# Altium footprint library ICs And Semiconductors THD.PcbLib: 292 footprints (part 17 of 19)
Each footprint in its own frame and in the unit in brackets; x right, y up, seen from the top. Pads: shape width x height; smd on the part's side, far side on the other; paste and mask are expansions set on the pad; w line width, h text height; cw(c..) or ccw(c..) is an arc to the next point about the centre after c.
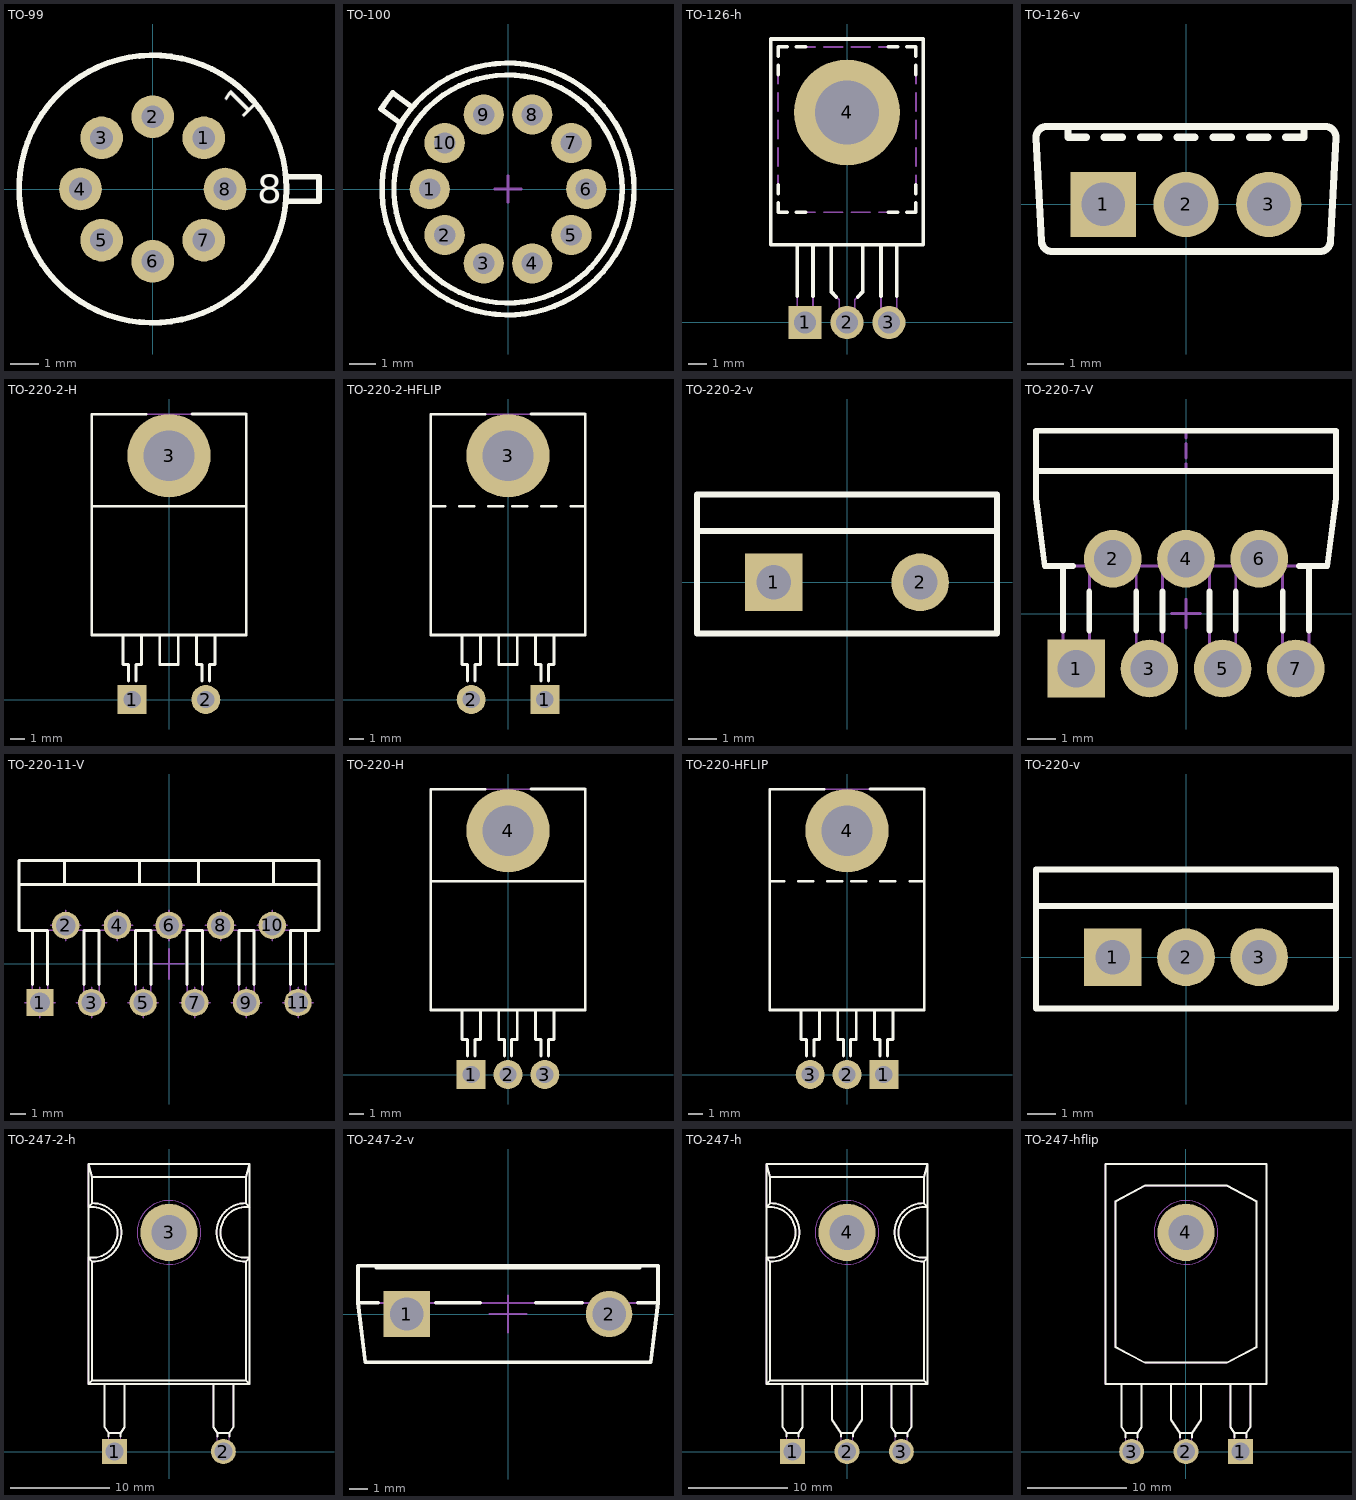
[diagram p16: the footprints below, top view; thin cyan lines are the x and y axes]

## TO-99 [mm] "TO-99, 8 Leads, Body Dia. 9.4mm (max)"
height 5.72
pads (8):
  round 1.5 hole 0.8: 1(1.796,1.796) 2(0,2.54) 3(-1.796,1.796) 4(-2.54,0) 5(-1.796,-1.796) 6(0,-2.54) 7(1.796,-1.796) 8(2.54,0)
Top Overlay:
  circle w0.2: c0,0 r4.699
  lines w0.2: 4.679,-0.432 5.842,-0.432 5.842,0.432 4.679,0.432
  text "1" at 3.098,2.391 h1
  text "8" at 3.667,-0.5 h1
Notvisible:
  text "7" at 2.239,-2.946 h1
  text "6" at -0.5,-3.69 h1
  text "5" at -2.946,-2.239 h1
  text "4" at -3.643,0.5 h1
  text "3" at -2.239,2.946 h1
  text "2" at 0.5,3.667 h1
Mechanical 14:
  circle w0.1: c0,0 r4.699
  lines w0.1: 4.679,-0.432 5.842,-0.432 5.842,0.432 4.679,0.432
3D body "TO-99.stp": height 5.72, standoff -3.78, extent -4.7,-4.7 5.842,4.7

## TO-100 [mm] "TO-100, 10 Leads, Body Dia. 9.4mm (max)"
height 6.99
pads (10):
  round 1.5 hole 0.8: 1(-2.92,0) 2(-2.362,-1.716) 3(-0.902,-2.777) 4(0.902,-2.777) 5(2.362,-1.716) 6(2.92,0) 7(2.362,1.716) 8(0.902,2.777) 9(-0.902,2.777) 10(-2.362,1.716)
Top Overlay:
  circle w0.2: c0,0 r4.7
  circle w0.2: c0,0 r4.255
  lines w0.2: -4.747,2.985 -4.011,2.45 ; -4.737,2.978 cw(c0,0) -4.296,3.585 ; -4.306,3.592 -3.57,3.057
Notvisible:
  lines w0.1: -3.42,0 -2.92,0 ; -2.92,-0.5 -2.92,0 ; -2.92,0.5 -2.92,0 ; -2.767,-2.01 -2.362,-1.716 ; -2.767,2.01 -2.362,1.716 ; -2.656,-1.312 -2.362,-1.716 ; -2.656,1.312 -2.362,1.716 ; -2.42,0 -2.92,0 ; -2.068,-2.121 -2.362,-1.716 ; -2.068,2.121 -2.362,1.716 ; -1.958,-1.422 -2.362,-1.716 ; -1.958,1.422 -2.362,1.716 ; -1.378,-2.623 -0.902,-2.777 ; -1.378,2.623 -0.902,2.777 ; -1.057,-3.253 -0.902,-2.777 ; -1.057,3.253 -0.902,2.777 ; -0.748,-2.302 -0.902,-2.777 ; -0.748,2.302 -0.902,2.777 ; -0.5,0 0,0 ; -0.427,-2.932 -0.902,-2.777 ; -0.427,2.932 -0.902,2.777 ; 0,-0.5 0,0 ; 0,0.5 0,0 ; 0.427,-2.932 0.902,-2.777 ; 0.427,2.932 0.902,2.777 ; 0.5,0 0,0 ; 0.748,-2.302 0.902,-2.777 ; 0.748,2.302 0.902,2.777 ; 1.057,-3.253 0.902,-2.777 ; 1.057,3.253 0.902,2.777 ; 1.378,-2.623 0.902,-2.777 ; 1.378,2.623 0.902,2.777 ; 1.958,-1.422 2.362,-1.716 ; 1.958,1.422 2.362,1.716 ; 2.068,-2.121 2.362,-1.716 ; 2.068,2.121 2.362,1.716 ; 2.42,0 2.92,0 ; 2.656,-1.312 2.362,-1.716 ; 2.656,1.312 2.362,1.716 ; 2.767,-2.01 2.362,-1.716 ; 2.767,2.01 2.362,1.716 ; 2.92,-0.5 2.92,0 ; 2.92,0.5 2.92,0 ; 3.42,0 2.92,0
Mechanical 14:
  circle w0.1: c0,0 r4.7
  circle w0.1: c0,0 r4.255
  lines w0.1: -4.747,2.985 -4.011,2.45 cw(c0,0) -3.57,3.057 -4.306,3.592 ; -4.737,2.978 cw(c0,0) -4.296,3.585
3D body "TO-100.stp": height 5.97, standoff -3.6, extent -4.737,-4.7 4.7,4.7

## TO-126-h [mm] "TO-126 3-Terminal - Horizontal Mount"
height 3.45
pads (4):
  rect 1.8x1.8 hole 1.2: 1(-2.28,0)
  round 1.8 hole 1.2: 2(0,0) 3(2.28,0)
  round 5.75 hole 3.5: 4(0,11.43)
Top Overlay:
  lines w0.2: -3.75,6.5 -3.75,6 -3.25,6 ; -3.75,7 -3.75,7.5 ; -3.75,13.5 -3.75,14 ; -3.75,14.5 -3.75,15 -3.25,15 ; -2.75,6 -2.25,6 ; -2.75,15 -2.25,15 ; -2.705,1.439 -2.705,4.23 ; -1.855,1.439 -1.855,4.23 ; -0.85,4.23 -0.85,1.655 -0.579,1.384 ; 0.579,1.384 0.85,1.655 0.85,4.23 ; 1.855,1.439 1.855,4.23 ; 2.25,6 2.75,6 ; 2.25,15 2.75,15 ; 2.705,1.439 2.705,4.23 ; 3.25,6 3.75,6 3.75,6.5 ; 3.25,15 3.75,15 3.75,14.5 ; 3.75,7 3.75,7.5 ; 3.75,13.5 3.75,14 ; -4.15,4.23 -4.15,15.43 4.15,15.43 4.15,4.23 -4.15,4.23
Mechanical 14:
  circle w0.1: c0,11.43 r1.75
  lines w0.1: -3.75,6.5 -3.75,6 -3.25,6 ; -3.75,7 -3.75,8 ; -3.75,8.5 -3.75,9.5 ; -3.75,10 -3.75,11 ; -3.75,11.5 -3.75,12.5 ; -3.75,13 -3.75,14 ; -3.75,14.5 -3.75,15 -3.25,15 ; -2.75,6 -1.75,6 ; -2.75,15 -1.75,15 ; -2.705,4.23 -2.705,0 -1.855,0 -1.855,4.23 ; -1.25,6 -0.25,6 ; -1.25,15 -0.25,15 ; -0.85,4.23 -0.85,1.655 -0.425,1.23 -0.425,0 0.425,0 0.425,1.23 0.85,1.655 0.85,4.23 ; 0.25,6 1.25,6 ; 0.25,15 1.25,15 ; 1.75,6 2.75,6 ; 1.75,15 2.75,15 ; 1.855,4.23 1.855,0 2.705,0 2.705,4.23 ; 3.25,6 3.75,6 3.75,6.5 ; 3.25,15 3.75,15 3.75,14.5 ; 3.75,7 3.75,8 ; 3.75,8.5 3.75,9.5 ; 3.75,10 3.75,11 ; 3.75,11.5 3.75,12.5 ; 3.75,13 3.75,14 ; -4.15,4.23 4.15,4.23 4.15,15.43 -4.15,15.43 -4.15,4.23
3D body "TO-126-H.stp": height 3.45, standoff -3.1, extent -4.134,-0.3 4.134,15.43

## TO-126-v [mm] "TO-126 3-Terminal - Vertical Mount"
height 14.2
pads (3):
  rect 1.8x1.8 hole 1.2: 1(-2.28,0)
  round 1.8 hole 1.2: 2(0,0) 3(2.28,0)
Top Overlay:
  lines w0.2: -3.25,2.15 -3.25,1.85 -2.75,1.85 ; -2.25,1.85 -1.75,1.85 ; -1.25,1.85 -0.75,1.85 ; -0.25,1.85 0.25,1.85 ; 0.75,1.85 1.25,1.85 ; 1.75,1.85 2.25,1.85 ; 2.75,1.85 3.25,1.85 3.25,2.15 ; -4.133,1.834 cw(c-3.834,1.85) -3.834,2.15 3.834,2.15 cw(c3.834,1.85) 4.133,1.834 3.984,-1.016 cw(c3.685,-1) 3.685,-1.3 -3.685,-1.3 cw(c-3.685,-1) -3.984,-1.016 -4.133,1.834
Mechanical 14:
  lines w0.1: -3.25,2.15 -3.25,1.85 -2.75,1.85 ; -2.25,1.85 -1.75,1.85 ; -1.25,1.85 -0.75,1.85 ; -0.25,1.85 0.25,1.85 ; 0.75,1.85 1.25,1.85 ; 1.75,1.85 2.25,1.85 ; 2.75,1.85 3.25,1.85 3.25,2.15 ; -4.133,1.834 cw(c-3.834,1.85) -3.834,2.15 3.834,2.15 cw(c3.834,1.85) 4.133,1.834 3.984,-1.016 cw(c3.685,-1) 3.685,-1.3 -3.685,-1.3 cw(c-3.685,-1) -3.984,-1.016 -4.133,1.834
3D body "TO-126-V.stp": height 14.2, standoff -3.1, extent -4.134,-1.3 4.134,2.15

## TO-220-2-H [mm] "TO-220 2-Terminal + Tab - Horizontal Mount"
height 4.7
pads (3):
  rect 2x2 hole 1.2: 1(-2.54,0)
  round 2 hole 1.2: 2(2.54,0)
  round 5.75 hole 3.5: 3(0,16.828)
Top Overlay:
  lines w0.2: -5.334,13.335 5.334,13.335 ; -3.175,4.445 -3.175,2.413 -2.794,2.413 -2.794,1.27 ; -2.286,1.27 -2.286,2.413 -1.905,2.413 -1.905,4.445 ; -1.6,19.685 -5.334,19.685 -5.334,4.445 5.334,4.445 5.334,19.685 5.319,19.7 1.6,19.7 ; -0.635,4.445 -0.635,2.413 0.635,2.413 0.635,4.445 ; 1.905,4.445 1.905,2.413 2.286,2.413 2.286,1.27 ; 2.794,1.27 2.794,2.413 3.175,2.413 3.175,4.445
Mechanical 14:
  circle w0.1: c0,16.828 r2
  lines w0.1: -5.334,13.335 5.334,13.335 ; -3.175,4.445 -3.175,2.413 -2.794,2.413 -2.794,1.27 ; -2.286,1.27 -2.286,2.413 -1.905,2.413 -1.905,4.445 ; -0.635,4.445 -0.635,2.413 0.635,2.413 0.635,4.445 ; 1.905,4.445 1.905,2.413 2.286,2.413 2.286,1.27 ; 2.794,1.27 2.794,2.413 3.175,2.413 3.175,4.445 ; -5.334,4.445 -5.334,19.685 5.334,19.685 5.334,4.445 -5.334,4.445
3D body "TO-220-2-H.stp": height 4.7, standoff -3.5, extent -5.27,-0.28 5.27,19.49

## TO-220-2-HFLIP [mm] "TO-220 2-Terminal + Tab - Flipped Horizontal Mount"
height 4.7
pads (3):
  rect 2x2 hole 1.2: 1(2.54,0)
  round 2 hole 1.2: 2(-2.54,0)
  round 5.75 hole 3.5: 3(0,16.828)
Top Overlay:
  lines w0.2: -5.334,13.335 -4.334,13.335 ; -3.334,13.335 -2.334,13.335 ; -3.175,4.445 -3.175,2.413 -2.794,2.413 -2.794,1.27 ; -2.286,1.27 -2.286,2.413 -1.905,2.413 -1.905,4.445 ; -1.6,19.685 -5.334,19.685 -5.334,4.445 5.334,4.445 5.334,19.685 5.319,19.7 1.6,19.7 ; -1.334,13.335 -0.334,13.335 ; -0.635,4.445 -0.635,2.413 0.635,2.413 0.635,4.445 ; 0.3,13.335 1.3,13.335 ; 1.905,4.445 1.905,2.413 2.286,2.413 2.286,1.27 ; 2.3,13.335 3.3,13.335 ; 2.794,1.27 2.794,2.413 3.175,2.413 3.175,4.445 ; 4.334,13.335 5.334,13.335
Mechanical 14:
  circle w0.1: c0,16.828 r2
  lines w0.1: -5.334,13.335 -4.334,13.335 ; -3.334,13.335 -2.334,13.335 ; -3.175,4.445 -3.175,2.413 -2.794,2.413 -2.794,1.27 ; -2.286,1.27 -2.286,2.413 -1.905,2.413 -1.905,4.445 ; -1.334,13.335 -0.334,13.335 ; -0.635,4.445 -0.635,2.413 0.635,2.413 0.635,4.445 ; 0.3,13.335 1.3,13.335 ; 1.905,4.445 1.905,2.413 2.286,2.413 2.286,1.27 ; 2.3,13.335 3.3,13.335 ; 2.794,1.27 2.794,2.413 3.175,2.413 3.175,4.445 ; 4.334,13.335 5.334,13.335 ; -5.334,4.445 -5.334,19.685 5.334,19.685 5.334,4.445 -5.334,4.445
3D body "TO-220-2-HFLIP.stp": height 4.7, standoff -4.7, extent -5.27,-0.28 5.27,19.49

## TO-220-2-v [mm] "TO-220 2-Terminal - Vertical Mount"
height 22.86
pads (2):
  rect 2x2 hole 1.2: 1(-2.54,0)
  round 2 hole 1.2: 2(2.54,0)
Top Overlay:
  lines w0.2: -5.207,1.778 5.207,1.778 ; -5.207,-1.778 -5.207,3.048 5.207,3.048 5.207,-1.778 -5.207,-1.778
Mechanical 14:
  lines w0.1: -5.207,1.778 5.207,1.778 ; -5.207,-1.778 -5.207,3.048 5.207,3.048 5.207,-1.778 -5.207,-1.778
3D body "TO-220-2-V.stp": height 20.5, standoff -3.5, extent -5.27,-1.75 5.27,2.95

## TO-220-7-V [mm] "TO-220 7 Leads - Vertical Mount"
height 21.37
pads (7):
  rect 2x2 hole 1.3: 1(-3.81,-1.905)
  round 2 hole 1.3: 2(-2.54,1.905) 3(-1.27,-1.905) 4(0,1.905) 5(1.27,-1.905) 6(2.54,1.905) 7(3.81,-1.905)
Top Overlay:
  lines w0.2: -5.205,4.95 5.205,4.95 ; -4.265,-0.581 -4.265,1.65 ; -3.917,1.65 -4.905,1.65 -5.205,4 -5.205,6.35 5.205,6.35 5.205,4 4.905,1.65 3.917,1.65 ; -3.355,-0.581 -3.355,0.767 ; -1.725,-0.581 -1.725,0.767 ; -0.815,-0.581 -0.815,0.767 ; 0.815,-0.581 0.815,0.767 ; 1.725,-0.581 1.725,0.767 ; 3.355,-0.581 3.355,0.767 ; 4.265,-0.581 4.265,1.65
Notvisible:
  lines w0.1: -4.31,-1.905 -3.81,-1.905 ; -3.81,-2.405 -3.81,-1.905 ; -3.81,-1.405 -3.81,-1.905 ; -3.31,-1.905 -3.81,-1.905 ; -3.04,1.905 -2.54,1.905 ; -2.54,1.405 -2.54,1.905 ; -2.54,2.405 -2.54,1.905 ; -2.04,1.905 -2.54,1.905 ; -1.77,-1.905 -1.27,-1.905 ; -1.27,-2.405 -1.27,-1.905 ; -1.27,-1.405 -1.27,-1.905 ; -0.77,-1.905 -1.27,-1.905 ; -0.5,0 0,0 ; -0.5,1.905 0,1.905 ; 0,-0.5 0,0 ; 0,0.5 0,0 ; 0,1.405 0,1.905 ; 0,2.405 0,1.905 ; 0,4.95 0,5.2 ; 0,5.4 0,5.65 0,5.9 ; 0,6.1 0,6.35 ; 0.5,0 0,0 ; 0.5,1.905 0,1.905 ; 0.77,-1.905 1.27,-1.905 ; 1.27,-2.405 1.27,-1.905 ; 1.27,-1.405 1.27,-1.905 ; 1.77,-1.905 1.27,-1.905 ; 2.04,1.905 2.54,1.905 ; 2.54,1.405 2.54,1.905 ; 2.54,2.405 2.54,1.905 ; 3.04,1.905 2.54,1.905 ; 3.31,-1.905 3.81,-1.905 ; 3.81,-2.405 3.81,-1.905 ; 3.81,-1.405 3.81,-1.905 ; 4.31,-1.905 3.81,-1.905
Mechanical 14:
  lines w0.1: -5.205,4.95 5.205,4.95 ; -4.265,1.65 -4.265,-2.23 -3.355,-2.23 -3.355,1.65 ; -2.995,1.65 -2.995,1.58 -2.085,1.58 -2.085,1.65 ; -1.725,1.65 -1.725,-2.23 -0.815,-2.23 -0.815,1.65 ; -0.455,1.65 -0.455,1.58 0.455,1.58 0.455,1.65 ; 0.815,1.65 0.815,-2.23 1.725,-2.23 1.725,1.65 ; 2.085,1.65 2.085,1.58 2.995,1.58 2.995,1.65 ; 3.355,1.65 3.355,-2.23 4.265,-2.23 4.265,1.65 ; -5.205,4 -5.205,6.35 5.205,6.35 5.205,4 4.905,1.65 -4.905,1.65 -5.205,4
3D body "TO-220-7-V.stp": height 21.74, standoff -3.8, extent -5.205,-2.23 5.205,6.35

## TO-220-11-V [mm] "TO-220 11 Leads - Vertical Mount"
height 20.82
pads (11):
  rect 1.8x1.8 hole 1.3: 1(-8.5,-2.54)
  round 1.8 hole 1.3: 2(-6.8,2.54) 3(-5.1,-2.54) 4(-3.4,2.54) 5(-1.7,-2.54) 6(0,2.54) 7(1.7,-2.54) 8(3.4,2.54) 9(5.1,-2.54) 10(6.8,2.54) 11(8.5,-2.54)
Top Overlay:
  lines w0.2: -9.88,5.23 9.88,5.23 ; -9,-1.34 -9,2.21 ; -8,-1.34 -8,2.21 -9.88,2.21 -9.88,6.83 9.88,6.83 9.88,2.21 8,2.21 8,-1.34 ; -6.88,5.23 -6.88,6.83 ; -5.6,-1.34 -5.6,2.21 -4.6,2.21 -4.6,-1.34 ; -2.2,-1.34 -2.2,2.21 -1.2,2.21 -1.2,-1.34 ; -1.93,5.23 -1.93,6.83 ; 1.2,-1.34 1.2,2.21 2.2,2.21 2.2,-1.34 ; 1.93,5.23 1.93,6.83 ; 4.6,-1.34 4.6,2.21 5.6,2.21 5.6,-1.34 ; 6.88,5.23 6.88,6.83 ; 9,-1.34 9,2.21
Notvisible:
  lines w0.1: -9.5,-2.54 -8.5,-2.54 ; -8.5,-3.54 -8.5,-2.54 ; -8.5,-1.54 -8.5,-2.54 ; -7.8,2.54 -6.8,2.54 ; -7.5,-2.54 -8.5,-2.54 ; -6.8,1.54 -6.8,2.54 ; -6.8,3.54 -6.8,2.54 ; -6.1,-2.54 -5.1,-2.54 ; -5.8,2.54 -6.8,2.54 ; -5.1,-3.54 -5.1,-2.54 ; -5.1,-1.54 -5.1,-2.54 ; -4.4,2.54 -3.4,2.54 ; -4.1,-2.54 -5.1,-2.54 ; -3.4,1.54 -3.4,2.54 ; -3.4,3.54 -3.4,2.54 ; -2.7,-2.54 -1.7,-2.54 ; -2.4,2.54 -3.4,2.54 ; -1.7,-3.54 -1.7,-2.54 ; -1.7,-1.54 -1.7,-2.54 ; -1,0 0,0 ; -1,2.54 0,2.54 ; -0.7,-2.54 -1.7,-2.54 ; 0,-1 0,0 ; 0,1 0,0 ; 0,1.54 0,2.54 ; 0,3.54 0,2.54 ; 0.7,-2.54 1.7,-2.54 ; 1,0 0,0 ; 1,2.54 0,2.54 ; 1.7,-3.54 1.7,-2.54 ; 1.7,-1.54 1.7,-2.54 ; 2.4,2.54 3.4,2.54 ; 2.7,-2.54 1.7,-2.54 ; 3.4,1.54 3.4,2.54 ; 3.4,3.54 3.4,2.54 ; 4.1,-2.54 5.1,-2.54 ; 4.4,2.54 3.4,2.54 ; 5.1,-3.54 5.1,-2.54 ; 5.1,-1.54 5.1,-2.54 ; 5.8,2.54 6.8,2.54 ; 6.1,-2.54 5.1,-2.54 ; 6.8,1.54 6.8,2.54 ; 6.8,3.54 6.8,2.54 ; 7.5,-2.54 8.5,-2.54 ; 7.8,2.54 6.8,2.54 ; 8.5,-3.54 8.5,-2.54 ; 8.5,-1.54 8.5,-2.54 ; 9.5,-2.54 8.5,-2.54
Mechanical 14:
  lines w0.1: -9.88,5.23 9.88,5.23 ; -9,2.21 -9,-2.84 -8,-2.84 -8,2.21 ; -6.88,5.23 -6.88,6.83 ; -5.6,2.21 -5.6,-2.84 -4.6,-2.84 -4.6,2.21 ; -2.2,2.21 -2.2,-2.84 -1.2,-2.84 -1.2,2.21 ; -1.93,5.23 -1.93,6.83 ; 1.2,2.21 1.2,-2.84 2.2,-2.84 2.2,2.21 ; 1.93,5.23 1.93,6.83 ; 4.6,2.21 4.6,-2.84 5.6,-2.84 5.6,2.21 ; 6.88,5.23 6.88,6.83 ; 8,2.21 8,-2.84 9,-2.84 9,2.21 ; -9.88,2.21 -9.88,6.83 9.88,6.83 9.88,2.21 -9.88,2.21
3D body "TO-220-11-V.stp": height 21.09, standoff -3.8, extent -9.88,-2.84 9.88,6.83

## TO-220-H [mm] "TO-220 3-Terminal + Tab - Horizontal Mount"
height 4.7
pads (4):
  rect 2x2 hole 1.2: 1(-2.54,0)
  round 2 hole 1.2: 2(0,0) 3(2.54,0)
  round 5.75 hole 3.5: 4(0,16.828)
Top Overlay:
  lines w0.2: -5.334,13.335 5.334,13.335 ; -3.175,4.445 -3.175,2.413 -2.794,2.413 -2.794,1.27 ; -2.286,1.27 -2.286,2.413 -1.905,2.413 -1.905,4.445 ; -1.6,19.685 -5.334,19.685 -5.334,4.445 5.334,4.445 5.334,19.685 5.319,19.7 1.6,19.7 ; -0.635,4.445 -0.635,2.413 -0.254,2.413 -0.254,1.27 ; 0.254,1.27 0.254,2.413 0.635,2.413 0.635,4.445 ; 1.905,4.445 1.905,2.413 2.286,2.413 2.286,1.27 ; 2.794,1.27 2.794,2.413 3.175,2.413 3.175,4.445
Mechanical 14:
  circle w0.1: c0,16.828 r2
  lines w0.1: -5.334,13.335 5.334,13.335 ; -3.175,4.445 -3.175,2.413 -2.794,2.413 -2.794,1.27 ; -2.286,1.27 -2.286,2.413 -1.905,2.413 -1.905,4.445 ; -0.635,4.445 -0.635,2.413 -0.254,2.413 -0.254,1.27 ; 0.254,1.27 0.254,2.413 0.635,2.413 0.635,4.445 ; 1.905,4.445 1.905,2.413 2.286,2.413 2.286,1.27 ; 2.794,1.27 2.794,2.413 3.175,2.413 3.175,4.445 ; -5.334,4.445 -5.334,19.685 5.334,19.685 5.334,4.445 -5.334,4.445
3D body "TO-220-H.stp": height 4.7, standoff -3.5, extent -5.27,-0.28 5.27,19.49

## TO-220-HFLIP [mm] "TO-220 3-Terminal + Tab - Flipped Horizontal Mount"
height 4.7
pads (4):
  rect 2x2 hole 1.2: 1(2.54,0)
  round 2 hole 1.2: 2(0,0) 3(-2.54,0)
  round 5.75 hole 3.5: 4(0,16.828)
Top Overlay:
  lines w0.2: -5.334,13.335 -4.334,13.335 ; -3.334,13.335 -2.334,13.335 ; -3.175,4.445 -3.175,2.413 -2.794,2.413 -2.794,1.27 ; -2.286,1.27 -2.286,2.413 -1.905,2.413 -1.905,4.445 ; -1.6,19.685 -5.334,19.685 -5.334,4.445 5.334,4.445 5.334,19.685 5.319,19.7 1.6,19.7 ; -1.334,13.335 -0.334,13.335 ; -0.635,4.445 -0.635,2.413 -0.254,2.413 -0.254,1.27 ; 0.254,1.27 0.254,2.413 0.635,2.413 0.635,4.445 ; 0.3,13.335 1.3,13.335 ; 1.905,4.445 1.905,2.413 2.286,2.413 2.286,1.27 ; 2.3,13.335 3.3,13.335 ; 2.794,1.27 2.794,2.413 3.175,2.413 3.175,4.445 ; 4.334,13.335 5.334,13.335
Mechanical 14:
  circle w0.1: c0,16.828 r2
  lines w0.1: -5.334,13.335 -4.334,13.335 ; -3.334,13.335 -2.334,13.335 ; -3.175,4.445 -3.175,2.413 -2.794,2.413 -2.794,1.27 ; -2.286,1.27 -2.286,2.413 -1.905,2.413 -1.905,4.445 ; -1.334,13.335 -0.334,13.335 ; -0.635,4.445 -0.635,2.413 -0.254,2.413 -0.254,1.27 ; 0.254,1.27 0.254,2.413 0.635,2.413 0.635,4.445 ; 0.3,13.335 1.3,13.335 ; 1.905,4.445 1.905,2.413 2.286,2.413 2.286,1.27 ; 2.3,13.335 3.3,13.335 ; 2.794,1.27 2.794,2.413 3.175,2.413 3.175,4.445 ; 4.334,13.335 5.334,13.335 ; -5.334,4.445 -5.334,19.685 5.334,19.685 5.334,4.445 -5.334,4.445
3D body "TO-220-HFLIP.stp": height 4.7, standoff -4.7, extent -5.27,-0.28 5.27,19.49

## TO-220-v [mm] "TO-220 3-Terminal - Vertical Mount"
height 22.86
pads (3):
  rect 2x2 hole 1.2: 1(-2.54,0)
  round 2 hole 1.2: 2(0,0) 3(2.54,0)
Top Overlay:
  lines w0.2: -5.207,1.778 5.207,1.778 ; -5.207,-1.778 5.207,-1.778 5.207,3.048 -5.207,3.048 -5.207,-1.778
Mechanical 14:
  lines w0.1: -5.207,1.778 5.207,1.778 ; -5.207,-1.778 5.207,-1.778 5.207,3.048 -5.207,3.048 -5.207,-1.778
3D body "TO-220-V.stp": height 20.5, standoff -3.5, extent -5.27,-1.75 5.27,2.95

## TO-247-2-h [mm] "TO-247 2-Terminal - Horizontal Mount"
height 5.26
pads (3):
  rect 2.5x2.5 hole 1.8: 1(-5.46,0)
  round 2.5 hole 1.8: 2(5.46,0)
  round 5.75 hole 3.5: 3(0,22)
Top Overlay:
  lines w0.2: -6.46,6.76 -6.46,2.44 -6.06,1.84 ; -6.06,1.5 -6.06,1.84 ; -4.86,1.5 -4.86,1.84 ; -4.46,6.76 -4.46,2.44 -4.86,1.84 ; 4.46,6.76 4.46,2.44 4.86,1.84 ; 4.86,1.5 4.86,1.84 ; 6.06,1.5 6.06,1.84 ; 6.46,6.76 6.46,2.44 6.06,1.84 ; 8.1,19.45 7.71,19.06 ; 8.1,19.49 cw(c7.71,22) 8.1,24.51 7.71,24.94 ; 8.1,28.86 7.71,27.567 ; -8.1,6.76 -8.1,28.86 ; -8.1,6.76 -7.71,7.153 ; -8.1,6.76 8.1,6.76 ; -8.1,28.86 -7.71,27.567 ; -8.1,28.86 8.103,28.869 8.1,6.76 ; -7.71,7.153 -7.71,19.06 ; -7.71,7.153 7.71,7.153 ; -7.71,19.06 ccw(c-7.71,22) -7.71,24.94 ; -7.71,19.06 -8.1,19.49 ccw(c-7.71,22) -8.1,24.51 -7.71,24.94 ; -7.71,24.94 -7.71,27.567 ; -7.71,27.567 7.71,27.567 ; -6.06,1.84 -4.86,1.84 ; 4.86,1.84 6.06,1.84 ; 7.71,7.153 8.1,6.76 ; 7.71,7.153 7.71,19.06 ; 7.71,19.06 cw(c7.71,22) 7.71,24.94 ; 7.71,24.94 7.71,27.567
Notvisible:
  lines w0.1: -6.46,0 -5.46,0 ; -5.46,-1 -5.46,0 ; -5.46,1 -5.46,0 ; -4.46,0 -5.46,0 ; -1,22 0,22 ; 0,21 0,22 ; 0,23 0,22 ; 1,22 0,22 ; 4.46,0 5.46,0 ; 5.46,-1 5.46,0 ; 5.46,1 5.46,0 ; 6.46,0 5.46,0
Mechanical 14:
  circle w0.1: c0,22 r3.202
  lines w0.1: -6.46,6.76 -6.46,2.44 -6.06,1.84 ; -4.46,6.76 -4.46,2.44 -4.86,1.84 ; 4.46,6.76 4.46,2.44 4.86,1.84 ; 6.46,6.76 6.46,2.44 6.06,1.84 ; 8.103,28.869 -8.1,28.86 ; -8.1,6.76 -7.71,7.153 ; -8.1,6.76 -8.1,19.49 ; -8.1,6.76 8.1,6.76 ; -8.1,19.49 ccw(c-7.71,22) -8.1,24.51 ; -8.1,19.49 -7.71,19.06 ; -8.1,24.51 -7.71,24.94 ; -8.1,24.51 -8.1,28.86 ; -8.1,28.86 -7.71,27.567 ; -7.71,7.153 -7.71,19.06 ; -7.71,7.153 7.71,7.153 ; -7.71,19.06 ccw(c-7.71,22) -7.71,24.94 ; -7.71,24.94 -7.71,27.567 ; -7.71,27.567 7.71,27.567 ; -6.06,1.84 -6.06,-0.5 -4.86,-0.5 -4.86,1.84 ; -6.06,1.84 -4.86,1.84 ; 4.86,1.84 4.86,-0.5 6.06,-0.5 6.06,1.84 ; 4.86,1.84 6.06,1.84 ; 7.71,7.153 8.1,6.76 ; 7.71,7.153 7.71,19.06 ; 7.71,19.06 cw(c7.71,22) 7.71,24.94 ; 7.71,19.06 8.1,19.49 ; 7.71,24.94 8.1,24.51 ; 7.71,24.94 7.71,27.567 ; 7.71,27.567 8.1,28.86 8.1,24.51 ; 8.1,6.76 8.1,19.49 ; 8.1,19.49 cw(c7.71,22) 8.1,24.51
3D body "TO-247-2-H.stp": height 5.2, standoff -3.8, extent -8.1,-0.5 8.1,28.86

## TO-247-2-v [mm] "TO-247 2-Terminal - Vertical Mount"
height 25
pads (2):
  rect 2.5x2.5 hole 1.8: 1(-5.46,0)
  round 2.5 hole 1.8: 2(5.46,0)
Top Overlay:
  lines w0.2: -7.1,2.6 -7.1,2.5 7.1,2.5 7.1,2.6 ; -7,0.6 -8.1,0.6 ; -3.9,0.6 -1.5,0.6 ; 1.5,0.6 4,0.6 ; 7,0.6 8.1,0.6 ; -8.1,0.6 -8.1,2.6 8.1,2.6 8.1,0.6 ; -8.1,0.6 -7.71,-2.6 7.71,-2.6 8.1,0.6
Notvisible:
  lines w0.1: -6.46,0 -5.46,0 ; -5.46,-1 -5.46,0 ; -5.46,1 -5.46,0 ; -4.46,0 -5.46,0 ; -1,0 0,0 ; 0,-1 0,0 ; 0,1 0,0 ; 1,0 0,0 ; 4.46,0 5.46,0 ; 5.46,-1 5.46,0 ; 5.46,1 5.46,0 ; 6.46,0 5.46,0
Mechanical 14:
  lines w0.1: -7.1,2.6 -7.1,2.5 7.1,2.5 7.1,2.6 ; -8.1,0.6 -8.1,2.6 8.1,2.6 8.1,0.6 ; -8.1,0.6 -7.71,-2.6 7.71,-2.6 8.1,0.6 ; -8.1,0.6 8.1,0.6
3D body "TO-247-2-V.stp": height 27.02, standoff -3.6, extent -8.1,-2.6 8.1,2.6

## TO-247-h [mm] "TO-247 3-Terminal - Horizontal Mount"
height 5.26
pads (4):
  rect 2.5x2.5 hole 1.8: 1(-5.46,0)
  round 2.5 hole 1.8: 2(0,0) 3(5.46,0)
  round 5.75 hole 3.5: 4(0,22)
Top Overlay:
  lines w0.2: -6.46,6.76 -6.46,2.44 -6.06,1.84 ; -6.06,1.5 -6.06,1.84 ; -4.86,1.5 -4.86,1.84 ; -4.46,6.76 -4.46,2.44 -4.86,1.84 ; -1.5,6.76 -1.5,3.19 -0.6,1.84 ; -0.6,1.5 -0.6,1.84 ; 0.6,1.5 0.6,1.84 ; 1.5,6.76 1.5,3.19 0.6,1.84 ; 4.46,6.76 4.46,2.44 4.86,1.84 ; 4.86,1.5 4.86,1.84 ; 6.06,1.5 6.06,1.84 ; 6.46,6.76 6.46,2.44 6.06,1.84 ; 8.1,19.45 7.71,19.06 ; 8.1,19.49 cw(c7.71,22) 8.1,24.51 7.71,24.94 ; 8.1,28.86 7.71,27.567 ; -8.1,6.76 8.1,6.76 ; -8.1,6.76 -7.71,7.153 ; -8.1,6.76 -8.1,28.86 ; -8.1,28.86 8.103,28.869 8.1,6.76 ; -8.1,28.86 -7.71,27.567 ; -7.71,7.153 7.71,7.153 ; -7.71,7.153 -7.71,19.06 ; -7.71,19.06 ccw(c-7.71,22) -7.71,24.94 ; -7.71,19.06 -8.1,19.49 ccw(c-7.71,22) -8.1,24.51 -7.71,24.94 ; -7.71,24.94 -7.71,27.567 ; -7.71,27.567 7.71,27.567 ; -6.06,1.84 -4.86,1.84 ; -0.6,1.84 0.6,1.84 ; 4.86,1.84 6.06,1.84 ; 7.71,7.153 7.71,19.06 ; 7.71,7.153 8.1,6.76 ; 7.71,19.06 cw(c7.71,22) 7.71,24.94 ; 7.71,24.94 7.71,27.567
Notvisible:
  lines w0.1: -6.46,0 -5.46,0 ; -5.46,-1 -5.46,0 ; -5.46,1 -5.46,0 ; -4.46,0 -5.46,0 ; -1,0 0,0 ; -1,22 0,22 ; 0,-1 0,0 ; 0,1 0,0 ; 0,21 0,22 ; 0,23 0,22 ; 1,0 0,0 ; 1,22 0,22 ; 4.46,0 5.46,0 ; 5.46,-1 5.46,0 ; 5.46,1 5.46,0 ; 6.46,0 5.46,0
Mechanical 14:
  circle w0.1: c0,22 r3.202
  lines w0.1: -6.46,6.76 -6.46,2.44 -6.06,1.84 ; -4.46,6.76 -4.46,2.44 -4.86,1.84 ; -1.5,6.76 -1.5,3.19 -0.6,1.84 ; 1.5,6.76 1.5,3.19 0.6,1.84 ; 4.46,6.76 4.46,2.44 4.86,1.84 ; 6.46,6.76 6.46,2.44 6.06,1.84 ; 8.103,28.869 -8.1,28.86 ; -8.1,6.76 8.1,6.76 ; -8.1,6.76 -8.1,19.49 ; -8.1,6.76 -7.71,7.153 ; -8.1,19.49 ccw(c-7.71,22) -8.1,24.51 ; -8.1,19.49 -7.71,19.06 ; -8.1,24.51 -8.1,28.86 ; -8.1,24.51 -7.71,24.94 ; -8.1,28.86 -7.71,27.567 ; -7.71,7.153 7.71,7.153 ; -7.71,7.153 -7.71,19.06 ; -7.71,19.06 ccw(c-7.71,22) -7.71,24.94 ; -7.71,24.94 -7.71,27.567 ; -7.71,27.567 7.71,27.567 ; -6.06,1.84 -4.86,1.84 ; -6.06,1.84 -6.06,-0.5 -4.86,-0.5 -4.86,1.84 ; -0.6,1.84 0.6,1.84 ; -0.6,1.84 -0.6,-0.5 0.6,-0.5 0.6,1.84 ; 4.86,1.84 6.06,1.84 ; 4.86,1.84 4.86,-0.5 6.06,-0.5 6.06,1.84 ; 7.71,7.153 7.71,19.06 ; 7.71,7.153 8.1,6.76 ; 7.71,19.06 cw(c7.71,22) 7.71,24.94 ; 7.71,19.06 8.1,19.49 ; 7.71,24.94 7.71,27.567 ; 7.71,24.94 8.1,24.51 ; 7.71,27.567 8.1,28.86 8.1,24.51 ; 8.1,6.76 8.1,19.49 ; 8.1,19.49 cw(c7.71,22) 8.1,24.51
3D body "TO-247-H.stp": height 5.2, standoff -3.8, extent -8.1,-0.5 8.1,28.86

## TO-247-hflip [mm] "TO-247 3-Terminal - Flipped Horizontal Mount"
height 5.26
pads (4):
  rect 2.5x2.5 hole 1.8: 1(5.46,0)
  round 2.5 hole 1.8: 2(0,0) 3(-5.46,0)
  round 5.75 hole 3.5: 4(0,22)
Top Overlay:
  lines w0.2: -6.46,6.76 -6.46,2.44 -6.06,1.84 ; -6.06,1.429 -6.06,1.84 ; -4.86,1.429 -4.86,1.84 ; -4.46,6.76 -4.46,2.44 -4.86,1.84 ; -1.5,6.76 -1.5,3.19 -0.6,1.84 ; -0.6,1.429 -0.6,1.84 ; 0.6,1.429 0.6,1.84 ; 1.5,6.76 1.5,3.19 0.6,1.84 ; 4.46,6.76 4.46,2.44 4.86,1.84 ; 4.86,1.429 4.86,1.84 ; 6.06,1.429 6.06,1.84 ; 6.46,6.76 6.46,2.44 6.06,1.84 ; 8.1,28.869 8.1,6.76 -8.1,6.76 -8.1,28.86 8.103,28.869 ; -6.06,1.84 -4.86,1.84 ; -0.6,1.84 0.6,1.84 ; 4.86,1.84 6.06,1.84 ; -7.1,10.51 -7.1,25.11 -4.1,26.7 4.1,26.7 7.1,25.11 7.1,10.51 4.1,8.92 -4.1,8.92 -7.1,10.51
Notvisible:
  lines w0.1: -5.46,0 -5.46,1 -5.46,0 ; -5.46,0 -5.46,-1 -5.46,0 ; -5.46,0 -4.46,0 -5.46,0 ; -5.46,0 -6.46,0 -5.46,0 ; 0,0 0,1 0,0 ; 0,0 0,-1 0,0 ; 0,0 1,0 0,0 ; 0,0 -1,0 0,0 ; 0,22 0,23 0,22 ; 0,22 0,21 0,22 ; 0,22 1,22 0,22 ; 0,22 -1,22 0,22 ; 5.46,0 5.46,1 5.46,0 ; 5.46,0 5.46,-1 5.46,0 ; 5.46,0 6.46,0 5.46,0 ; 5.46,0 4.46,0 5.46,0
Mechanical 14:
  circle w0.1: c0,22 r3.202
  lines w0.1: -6.46,6.76 -6.46,2.44 -6.06,1.84 ; -4.46,6.76 -4.46,2.44 -4.86,1.84 ; -1.5,6.76 -1.5,3.19 -0.6,1.84 ; 1.5,6.76 1.5,3.19 0.6,1.84 ; 4.46,6.76 4.46,2.44 4.86,1.84 ; 6.46,6.76 6.46,2.44 6.06,1.84 ; 8.1,28.869 8.1,6.76 -8.1,6.76 -8.1,28.86 8.103,28.869 ; -6.06,1.84 -6.06,-0.5 -4.86,-0.5 -4.86,1.84 ; -6.06,1.84 -4.86,1.84 ; -0.6,1.84 -0.6,-0.5 0.6,-0.5 0.6,1.84 ; -0.6,1.84 0.6,1.84 ; 4.86,1.84 4.86,-0.5 6.06,-0.5 6.06,1.84 ; 4.86,1.84 6.06,1.84 ; -7.1,10.51 -7.1,25.11 -4.1,26.7 4.1,26.7 7.1,25.11 7.1,10.51 4.1,8.92 -4.1,8.92 -7.1,10.51
3D body "TO-247-HFLIP.stp": height 5.2, standoff -3.8, extent -8.1,-0.5 8.1,28.86